# Altium footprint library PCB.PcbLib: 50 footprints (part 1 of 4)
Each footprint in its own frame and in the unit in brackets; x right, y up, seen from the top. Pads: shape width x height; smd on the part's side, far side on the other; paste and mask are expansions set on the pad; w line width, h text height; cw(c..) or ccw(c..) is an arc to the next point about the centre after c.
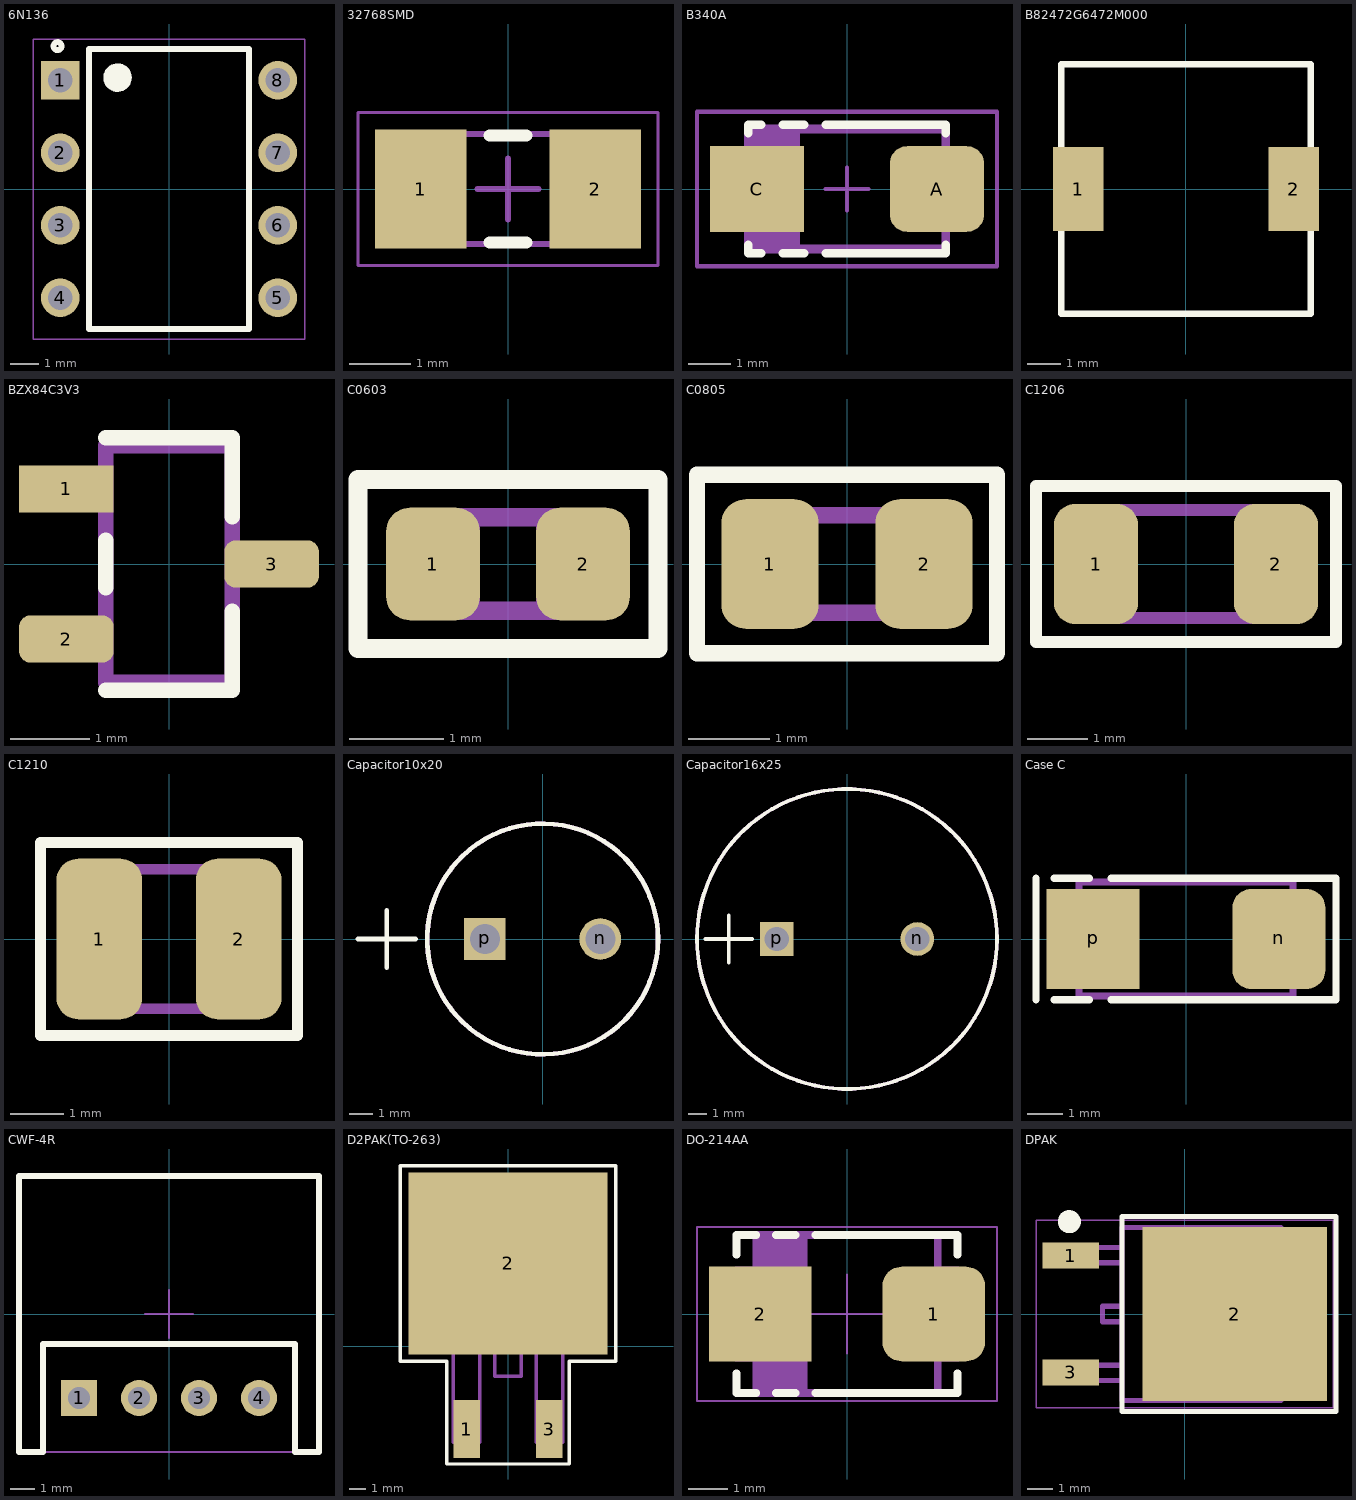
[diagram p0: the footprints below, top view; thin cyan lines are the x and y axes]

## 6N136 [mm]
pads (8):
  rect 1.35x1.35 hole 0.85: 1(-3.81,3.81)
  round 1.35 hole 0.85: 2(-3.81,1.27) 3(-3.81,-1.27) 4(-3.81,-3.81) 5(3.81,-3.81) 6(3.81,-1.27) 7(3.81,1.27) 8(3.81,3.81)
Top Overlay:
  circle w0.2: c-1.9,3.9 r0.141
  circle w0.2: c-1.7,3.9 r0.2
  circle w0.2: c-1.8,3.9 r0.224
  circle w0.2: c-3.9,5 r0.141
  circle w0.2: c-1.8,3.9 r0.4
  lines w0.2: -2.8,-4.9 -2.8,4.9 2.8,4.9 2.8,-4.9 -2.8,-4.9
Mechanical 15:
  lines w0.05: -4.75,-5.25 -4.75,5.25 4.75,5.25 4.75,-5.25 -4.75,-5.25
3D body "6N136M.STEP": height 5.08, standoff -3.9, extent -3.985,-4.827 3.935,4.828

## 32768SMD [mm] "32768SMD"
height 1
pads (2):
  rect 1.5x1.95 smd: 1(-1.425,0) 2(1.425,0)
Top Overlay:
  lines w0.2: -0.3,-0.875 0.3,-0.875 ; -0.3,0.875 0.3,0.875
Mechanical 13:
  lines w0.1: -1.75,-0.9 -1.75,0.9 1.75,0.9 1.75,-0.9 -1.75,-0.9
Mechanical 15:
  lines w0.05: -2.45,-1.25 -2.45,1.25 2.45,1.25 2.45,-1.25 -2.45,-1.25
  lines w0.1: -0.5,0 0.5,0 ; 0,-0.5 0,0.5
3D body: height 1, standoff 0, extent -0.75,-0.9 0.75,0.9
3D body: height 1, standoff 0, extent -1.75,-0.9 -0.75,0.9
3D body: height 1, standoff 0, extent 0.75,-0.9 1.75,0.9

## B340A [mm] "(SMA) Low profile package"
height 2.62
pads (2):
  rrect40% 2.2x2 smd: A(2.1,0)
  rect 2.2x2 smd: C(-2.1,0)
Top Overlay:
  lines w0.2: -2.3,-1.3 -2.3,-1.5 -2,-1.5 ; -2.3,1.3 -2.3,1.5 -2,1.5 ; -1.5,-1.5 -1,-1.5 ; -1.5,1.5 -1,1.5 ; -0.5,-1.5 2.3,-1.5 2.3,-1.3 ; -0.5,1.5 2.3,1.5 2.3,1.3
Top Assembly:
  rectangle: -2.3,-1.4 -1.1,1.4
  lines w0.2: -2.3,-0.8 -2.7,-0.8 -2.7,0.8 -2.3,0.8 ; 2.3,-0.8 2.7,-0.8 2.7,0.8 2.3,0.8 ; -2.3,-1.4 2.3,-1.4 2.3,1.4 -2.3,1.4 -2.3,-1.4
  text ".Designator" at -1,-0.5 h1.8
Mechanical 15:
  lines w0.1: -0.5,0 0.5,0 ; 0,-0.5 0,0.5 ; -3.5,-1.8 3.5,-1.8 3.5,1.8 -3.5,1.8 -3.5,-1.8
3D body "DO-214AC SMA Diode.step": height 2.4, standoff 0, extent -2.6,-1.3 2.6,1.3

## B82472G6472M000 [mm]
height 4.5
pads (2):
  rect 1.5x2.5 smd: 1(-3.2,0) 2(3.2,0)
Top Overlay:
  lines w0.2: -3.7,3.675 -3.7,-3.7 3.7,-3.7 3.7,3.675 ; -3.7,3.7 3.7,3.7
3D body "B82472G6472M000.STEP": height 3.5, standoff 0, extent -3.65,-3.65 3.65,3.65

## BZX84C3V3 [mm] "TO-236, SOT-346, SC59"
height 1.3
pads (3):
  rect 1.2x0.6 smd: 1(-1.3,0.95)
  rrect50% 1.2x0.6 smd: 2(-1.3,-0.95) 3(1.3,0)
Top Overlay:
  lines w0.2: -0.8,-1.6 0.8,-1.6 0.8,-0.6 ; -0.8,-0.3 -0.8,0.3 ; -0.8,1.6 0.8,1.6 0.8,0.6
Top Assembly:
  lines w0.2: -0.8,-1.1 -1.3,-1.1 -1.3,-0.775 -0.8,-0.775 ; -0.8,0.8 -1.3,0.8 -1.3,1.1 -0.8,1.1 ; 0.8,-0.175 1.3,-0.175 1.3,0.175 0.8,0.175 ; -0.8,-1.5 -0.8,1.5 0.8,1.5 0.8,-1.5 -0.8,-1.5
  text "'.Designator'" at -1.125,-0.725 h2.4
3D body "User Library-sot23-1.STEP": height 1, standoff 0, extent -1.17,-1.46 1.17,1.46

## C0603 [mm] "1608(Metric)"
height 1.1
pads (2):
  rrect50% 1x1.2 smd: 1(-0.8,0) 2(0.8,0)
Top Overlay:
  lines w0.2: -1.6,-0.9 1.6,-0.9 1.6,0.9 -1.6,0.9 -1.6,-0.9
Top Assembly:
  lines w0.2: -0.4,-0.5 -0.4,0.5 ; 0.4,-0.5 0.4,0.5 ; -0.8,-0.5 -0.8,0.5 0.8,0.5 0.8,-0.5 -0.8,-0.5
  text "'.Designator'" at 1,-0.75 h2.4
3D body "CAP0603.stp": height 1.1, standoff 0, extent -0.8,-0.5 0.8,0.5

## C0805 [mm] "2012(Metric)"
height 2
pads (2):
  rrect50% 1.2x1.6 smd: 1(-0.95,0) 2(0.95,0)
Top Overlay:
  lines w0.2: -1.85,-1.1 -1.85,1.1 1.85,1.1 1.85,-1.1 -1.85,-1.1
Top Assembly:
  lines w0.2: -0.6,-0.6 -0.6,0.6 ; 0.6,-0.6 0.6,0.6 ; -1,-0.6 1,-0.6 1,0.6 -1,0.6 -1,-0.6
  text "'.Designator'" at 0.95,-0.85 h2.4
3D body "0805.stp": height 1.5, standoff 0, extent -1,-0.725 1,0.725

## C1206 [mm] "3216(Metric)"
height 2.6
pads (2):
  rrect50% 1.4x2 smd: 1(-1.5,0) 2(1.5,0)
Top Overlay:
  lines w0.2: -2.5,-1.3 2.5,-1.3 2.5,1.3 -2.5,1.3 -2.5,-1.3
Top Assembly:
  lines w0.2: -1.1,-0.9 -1.1,0.9 ; 1.1,-0.9 1.1,0.9 ; -1.7,-0.9 -1.7,0.9 1.7,0.9 1.7,-0.9 -1.7,-0.9
  text ".Designator" at 2,-0.75 h2.5
3D body "1206.stp": height 1.5, standoff 0, extent -1.6,-0.9 1.6,0.9

## C1210 [mm] "3225(Metric)"
height 1.8
pads (2):
  rrect50% 1.6x3 smd: 1(-1.3,0) 2(1.3,0)
Top Overlay:
  lines w0.2: -2.4,-1.8 -2.4,1.8 2.4,1.8 2.4,-1.8 -2.4,-1.8
Top Assembly:
  lines w0.2: -0.9,-1.3 -0.9,1.3 ; 0.9,-1.3 0.9,1.3 ; -1.6,-1.3 -1.6,1.3 1.6,1.3 1.6,-1.3 -1.6,-1.3
  text ".Designator" at 2,-0.75 h2.5
3D body "1210.stp": height 1.5, standoff 0, extent -1.6,-1.425 1.6,1.425

## Capacitor10x20 [mm]
height 20
pads (2):
  round 1.8 hole 1.3: n(2.5,0)
  rect 1.8x1.8 hole 1.3: p(-2.5,0)
Top Overlay:
  circle w0.2: c0,0 r5
  lines w0.2: -8,0 -5.5,0 ; -6.75,-1.25 -6.75,1.25
Top Assembly:
  circle w0.2: c0,0 r5
3D body: height 21, standoff 1, extent -5,-5 5,5

## Capacitor16x25 [mm]
height 25
pads (2):
  round 1.8 hole 1.3: n(3.75,0)
  rect 1.8x1.8 hole 1.3: p(-3.75,0)
Top Overlay:
  circle w0.2: c0,0 r8
  lines w0.2: -7.55,0 -5.05,0 ; -6.3,-1.25 -6.3,1.25
Top Assembly:
  circle w0.2: c0,0 r8
3D body "SC (16x25).stp": height 28, standoff -2.7, extent -8,-8 8,8

## Case C [mm] "C6032-P"
height 2.8
pads (2):
  rrect40% 2.6x2.8 smd: n(2.6,0)
  rect 2.6x2.8 smd: p(-2.6,0)
Top Overlay:
  lines w0.2: -4.2,-1.7 -4.2,1.7 ; -3.7,-1.7 -2.7,-1.7 ; -3.7,1.7 -2.7,1.7 ; -2.1,-1.7 4.2,-1.7 4.2,1.7 -2.1,1.7
Top Assembly:
  lines w0.2: -2.5,0 -1.5,0 ; -2,-0.5 -2,0.5 ; -3,-1.6 -3,1.6 3,1.6 3,-1.6 -3,-1.6
  text "'.Designator'" at 3,-0.75 h2.4
3D body "Case C.stp": height 2.8, standoff -0.01, extent -3.152,-1.7 3.15,1.7

## CWF-4R [mm]
height 7.7
pads (4):
  rect 1.5x1.5 hole 0.9: 1(-3.75,-3.5)
  round 1.5 hole 0.9: 2(-1.25,-3.5) 3(1.25,-3.5) 4(3.75,-3.5)
Top Overlay:
  lines w0.25: -6.25,-5.75 -5.25,-5.75 -5.25,-1.25 5.25,-1.25 5.25,-5.75 6.25,-5.75 6.25,5.75 -6.25,5.75 -6.25,-5.75
Mechanical 13:
  lines w0.1: -6.25,-5.75 -6.25,5.75 6.25,5.75 6.25,-5.75 5.25,-5.75 5.25,-1.25 -5.25,-1.25 -5.25,-5.75 -6.25,-5.75
Mechanical 15:
  lines w0.1: -1,0 1,0 ; 0,-1 0,1 ; -6.25,-5.75 6.25,-5.75 6.25,5.75 -6.25,5.75 -6.25,-5.75
3D body "User Library-DS1069-4 MR TypeA.step": height 5.85, standoff -3.3, extent -6.2,-5.75 6.2,5.75

## D2PAK(TO-263) [mm]
height 4.6
pads (3):
  rect 1.6x3.5 smd: 1(-2.5,-5) 3(2.5,-5)
  rect 12x11 smd: 2(0,5)
Top Overlay:
  lines w0.2: -6.5,-0.9 -6.5,10.9 6.5,10.9 6.5,-0.9 3.7,-0.9 3.7,-7.1 -3.7,-7.1 -3.7,-0.9 -6.5,-0.9
Top Assembly:
  lines w0.2: -3.3,-0.3 -3.3,-5.8 -1.7,-5.8 -1.7,-0.3 ; -0.8,-0.3 -0.8,-1.8 0.8,-1.8 0.8,-0.3 ; 1.7,-0.3 1.7,-5.8 3.3,-5.8 3.3,-0.3 ; -5,-0.3 5,-0.3 5,10.2 -5,10.2 -5,-0.3
  text "'.Designator'" at -4.3,4.7 h2.4
3D body "to-263.STEP": height 4.3, standoff 0, extent -5,-5.78 5,10.1

## DO-214AA [mm] "(SMB) Low profile package"
height 2.62
pads (2):
  rrect40% 2.6x2.4 smd: 1(2.2,0)
  rect 2.6x2.4 smd: 2(-2.2,0)
Top Overlay:
  lines w0.2: -2.8,-1.5 -2.8,-2 -2.3,-2 ; -2.8,1.5 -2.8,2 ; -2.3,2 -2.8,2 ; -1.8,-2 -1.3,-2 ; -1.8,2 -1.3,2 ; -0.8,-2 2.8,-2 2.8,-1.5 ; -0.8,2 2.8,2 2.8,1.5 ; -2.8,2 -2.8,2
Top Assembly:
  rectangle: -2.3,-2 -1,2
  lines w0.2: -2.3,-1.1 -2.8,-1.1 -2.8,1.1 -2.3,1.1 ; 2.3,-1.1 2.8,-1.1 2.8,1.1 2.3,1.1 ; -2.3,-2 2.3,-2 2.3,2 -2.3,2 -2.3,-2
  text "'.Designator'" at -0.8,-0.7 h2.4
Mechanical 15:
  lines w0.05: -1,0 1,0 ; 0,-1 0,1 ; -3.8,-2.2 -3.8,2.2 3.8,2.2 3.8,-2.2 -3.8,-2.2
3D body "DO-214AA.stp": height 2.45, standoff -0.01, extent -2.828,-1.975 2.828,1.975

## DPAK [mm] "КТ-89, TO252"
height 2.3
pads (3):
  rect 2.2x1 smd: 1(-4.45,2.28) 3(-4.45,-2.28)
  rect 7.2x6.8 smd: 2(1.95,0)
Top Overlay:
  circle w0.5: c-4.5,3.6 r0.2
  lines w0.2: -2.45,-3.8 -2.45,3.8 5.9,3.8 5.9,-3.8 -2.45,-3.8
Top Assembly:
  lines w0.2: -2.45,-2.6 -5,-2.6 -5,-2 -2.45,-2 ; -2.45,-0.3 -3.2,-0.3 -3.2,0.3 -2.45,0.3 ; -2.45,2 -5,2 -5,2.6 -2.45,2.6 ; 3.8,2.6 4.7,2.6 4.7,-2.6 3.86,-2.6 ; -2.45,-3.375 3.76,-3.375 3.76,3.375 -2.45,3.375 -2.45,-3.375
  text ".Designator" at -4,-0.5 h2.5
Mechanical 15:
  lines w0.05: -5.8,-3.65 -5.8,3.65 5.8,3.65 5.8,-3.65 -5.8,-3.65
  lines w0.1: -0.5,0 0.5,0 ; 0,-0.5 0,0.5
3D body "CircuitWorks-TO-252.step": height 2.3, standoff 0, extent -4.973,-3.29 4.727,3.29